# Altium footprint library My Library.PCBLIB: 198 footprints (part 2 of 13)
Each footprint in its own frame and in the unit in brackets; x right, y up, seen from the top. Pads: shape width x height; smd on the part's side, far side on the other; paste and mask are expansions set on the pad; w line width, h text height; cw(c..) or ccw(c..) is an arc to the next point about the centre after c.
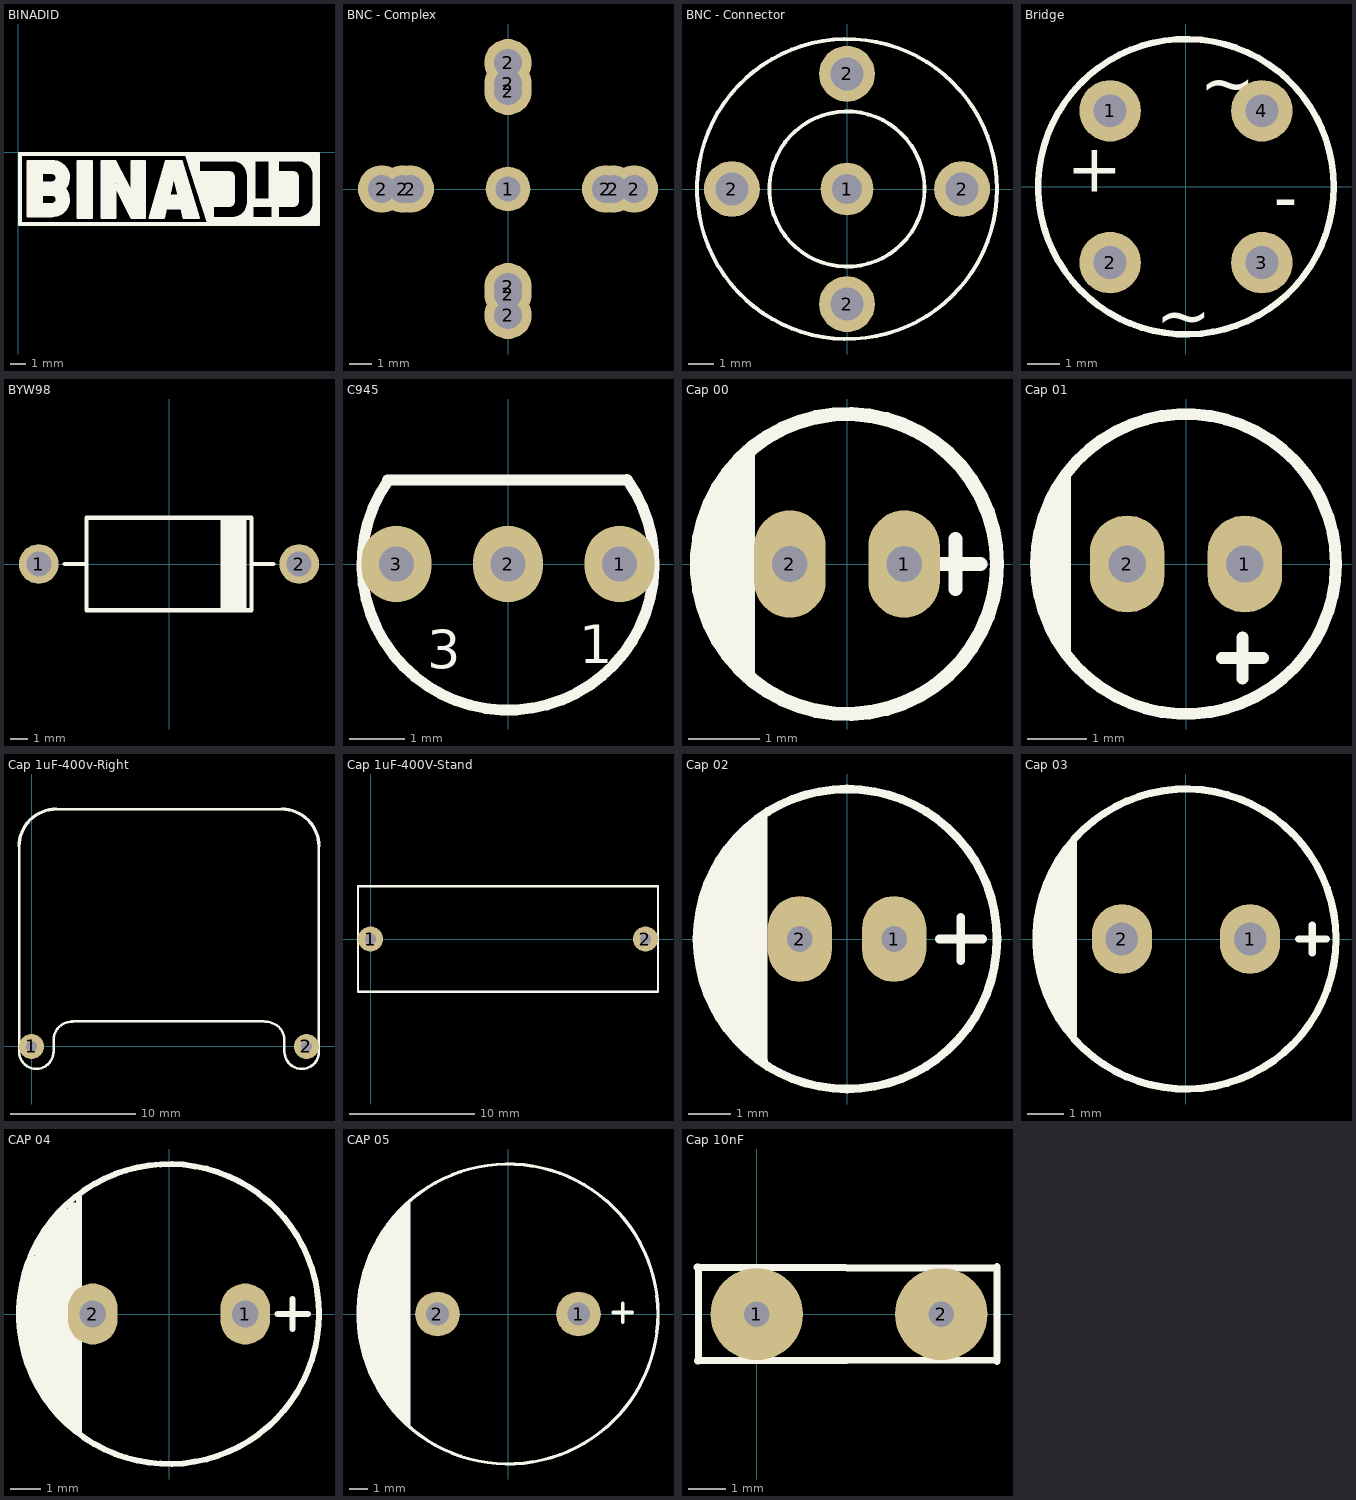
[diagram p1: the footprints below, top view; thin cyan lines are the x and y axes]

## BINADID [mil]
height 118.11
Top Overlay:
  drawing of 405 lines, arcs and shapes, not listed

## BNC - Complex [mil]
pads (13):
  round 80 hole 45: 1(0,0)
  round 85 hole 50: 2(-226.38,0) 2(-188.98,0) 2(-175.2,0) 2(0,-226.38) 2(0,-188.98) 2(0,-175.2) 2(0,175.2) 2(0,188.98) 2(0,226.38) 2(175.2,0) 2(188.98,0) 2(226.38,0)
3D body "BNC_complex.STEP": height 1369.68, standoff -173.23, extent -278,-278.21 278,278.2

## BNC - Connector [mil]
pads (5):
  round 80 hole 45: 1(0,0)
  round 85 hole 50: 2(-175.2,0) 2(0,-175.2) 2(0,175.2) 2(175.2,0)
Top Overlay:
  circle w5.91: c0,0 r228.35
  circle w5.91: c0,0 r118.11
3D body "My BNC Short.STEP": height 538.19, standoff -173.23, extent -218.11,-218.11 218.11,218.11

## Body [mil]
3D body "Body Base2.STEP": height 19.69, standoff -492.13, extent -145.67,-165.35 4190.86,4165.19

## Bridge [mm]
height 5.1
pads (4):
  round 1.905 hole 1.016: 1(-2.35,2.35) 2(-2.35,-2.35) 3(2.35,-2.35) 4(2.35,2.35)
Top Overlay:
  circle w0.2: c0,0 r4.572
  text "-" at 2.723,-1.054 h1.5
  text "+" at -3.698,-0.152 h1.5
  text "~" at -0.942,-4.714 h1.5
  text "~" at 0.432,2.489 h1.5
3D body "bridge.STEP": height 5.21, standoff -1.9, extent -3.923,-4.064 4.177,4.036

## BYW98 [mil]
pads (2):
  round 90 hole 57: 1(-295,0) 2(295,0)
Top Overlay:
  region: 175.2,105 175.2,-105 117.72,-105 117.72,105
  lines w10: -236.22,0 -187,0 ; 187,0 236.22,0 ; -187,-105 -187,105 187,105 187,-105 -187,-105
3D body "BYW98.STEP": height 254.33, standoff -86.22, extent -320.47,-105.51 321.26,103.15

## C945 [mil] "NPN Transistor"
height 236.22
pads (3):
  oval 50x55 hole 25: 1(80,0) 2(0,0) 3(-80,0)
Top Overlay:
  lines w7.87: -86.22,60.24 84.65,60.24 ; -85.85,59.98 ccw(c0,0) 85.32,60.72
  text "3" at -58,-75 h27.56
  text "1" at 51,-71.26 h27.56
3D body "SW3dPS-TO-92A.STEP": height 314.96, standoff -118.11, extent -94,-96.36 94.98,58.36

## Cap 00 [mm]
pads (2):
  oval 1x1.5 hole 0.5: 1(0.8,0) 2(-0.8,0)
Top Overlay:
  circle w0.2: c0,0 r2.1
  lines w0.2: -1.93,-0.76 -1.93,0.8 -1.92,0.81 ; -1.75,-1.12 -1.75,1.15 ; -1.57,1.36 -1.57,-1.33 -1.56,-1.34 ; -1.39,-1.54 -1.39,1.55 ; 1.17,0 1.87,0 ; 1.52,-0.35 1.52,0.35

## Cap 01 [mil]
pads (2):
  oval 50x65 hole 25: 1(39.37,0) 2(-39.37,0)
Top Overlay:
  circle w7.87: c0,0 r100.39
  region: -77,-65 -77,64 -87,51 -94,36 -100,11 -99,-18 -92,-44
  lines w7.87: 24,-63 51.56,-63 ; 37.78,-76.78 37.78,-49.22
3D body "SW3dPS-Cap electro 5x11x2mm.STEP": height 493.76, standoff -88.81, extent -99.42,-99.42 99.43,99.43

## Cap 1uF-400v-Right [mm]
pads (2):
  round 2 hole 0.85: 1(0,0) 2(22,0)
Top Overlay:
  lines w0.2: -1,16 -1,-0.4 ccw(c0.38,-0.4) 1.76,-0.4 1.76,0.52 cw(c3.236,0.514) 3.305,1.988 ; 2,19 20,19 ; 3.2,2 18.59,2.003 ; 18.695,1.968 cw(c18.764,0.494) 20.24,0.5 20.24,-0.42 ccw(c21.62,-0.42) 23,-0.42 23,16
  lines w0.254: -1.001,16 cw(c2,16) 2,19.001 ; 20,19.001 cw(c20,16) 23.001,16

## Cap 1uF-400V-Stand [mm]
height 16.65
pads (2):
  round 2 hole 0.85: 1(0,0) 2(22,0)
Top Overlay:
  lines w0.2: -1,-4.23 -1,4.23 23,4.23 23,-4.23 -1,-4.23

## Cap 02 [mm]
pads (2):
  oval 1.5x2 hole 0.6: 1(1.1,0) 2(-1.1,0)
Top Overlay:
  circle w0.2: c0,0 r3.5
  lines w0.2: -3.34,-1.02 -3.34,0.96 ; -3.17,-1.45 -3.17,1.47 ; -3,1.8 -3,-1.79 -2.99,-1.8 ; 2.15,0 3.166,0 ; 2.658,-0.508 2.658,0.508
  lines w0.254: -2.81,-2.01 -2.81,2.03 ; -2.59,-2.29 -2.59,2.3 -2.58,2.31 ; -2.37,-2.51 -2.37,2.52 -2.36,2.53 ; -2.2,-2.67 -2.2,2.59 ; -1.98,2.84 -1.98,-2.84 -1.97,-2.85 ; -2.81,2.03 -2.81,2.03

## Cap 03 [mil]
pads (2):
  oval 65x75 hole 35: 1(68.9,0) 2(-68.9,0)
Top Overlay:
  circle w7.87: c0,0 r161.42
  lines w7.87: -153.66,-42.13 -153.66,43.7 ; 121,0 151,0 ; 136,-15 136,15
  lines w10: -146.18,-64.17 -146.18,63.78 ; -137.52,-81.89 -137.52,81.5 ; -128.86,-94.88 -128.86,95.28 ; -122.17,-103.15 -122.17,103.94
3D body "SW3dPS-Cap electro 8x11.5x3.5mm_V2008.STEP": height 473.44, standoff -136.91, extent -159.48,-159 157.48,157.96

## CAP 04 [mil]
pads (2):
  oval 65x80 hole 35: 1(100,0) 2(-100,0)
Top Overlay:
  circle w7.87: c0,0 r196.85
  rectangle: -177.83,-74.62 -117.98,71.44
  lines w7.87: -190.91,-47 -190.91,46 ; -183.91,-63 -183.91,62 ; -177.83,-74.62 -177.83,71.44 ; -177.83,73.02 -117.98,73.02 ; -175.07,-77.77 -117.98,-77.77 ; -174.68,80.5 -117.98,80.5 ; -173.89,-84.86 -117.98,-84.86 ; -171.53,87.19 -117.98,87.19 ; -170.35,-91.94 -117.98,-91.94 ; -167.98,93.88 -117.98,93.88 ; -166.8,-98.64 -117.98,-98.64 ; -164.05,100.57 -117.98,100.57 ; -163.26,-105.33 -117.98,-105.72 ; -159.72,107.66 -117.98,107.66 ; -158.14,-112.42 -117.98,-112.42 ; -155.39,114.35 -117.98,114.35 ; -152.63,-119.9 -117.98,-119.9 ; -150.27,121.05 -117.98,121.05 ; -147.12,-127.38 -117.98,-127.38 ; -144.76,127.35 -144.36,127.74 -117.98,127.74 ; -140.82,-134.46 -117.98,-134.46 ; -138.46,134.43 -138.06,134.83 -117.98,134.83 ; -134.13,-141.16 -117.98,-141.16 ; -130.98,142.31 -117.98,142.31 ; -127.83,-146.67 -117.98,-146.67 ; -117.98,-155.72 -117.98,153.72 ; 142.13,0 182.13,0 ; 162.13,-20 162.13,20
3D body "SW3dPS-Cap electro 10x12.5x5.0mm.STEP": height 512.81, standoff -136.91, extent -197.7,-197 198,198.7

## CAP 05 [mil]
pads (2):
  round 95 hole 48: 1(150,0) 2(-150,0)
Top Overlay:
  circle w7: c0,0 r318.9
  region: -211,-238 -211,235 -241,210 -273,164 -302,100 -315,50 -319,-2 -309,-79 -286,-141 -249,-200
  lines w7.87: -211,-238 -211,235 ; 224,3 264,3 ; 244,-17 244,23
3D body "SW3dPS-Cap electro 16.2x16x7.62mm_V2008.STEP": height 650.61, standoff -147.28, extent -320,-320 319.8,319.8

## Cap 10nF [mm]
pads (2):
  round 2.5 hole 0.7: 1(0,0) 2(5,0)
Top Overlay:
  lines w0.2: -1.62,1.27 6.47,1.24 ; -1.6,-1.26 6.51,-1.24 ; -1.58,-1.26 -1.58,1.27 ; 6.51,-1.28 6.51,1.29